# Altium footprint library myLibraryAltium.PcbLib: 215 footprints (part 8 of 14)
Each footprint in its own frame and in the unit in brackets; x right, y up, seen from the top. Pads: shape width x height; smd on the part's side, far side on the other; paste and mask are expansions set on the pad; w line width, h text height; cw(c..) or ccw(c..) is an arc to the next point about the centre after c.
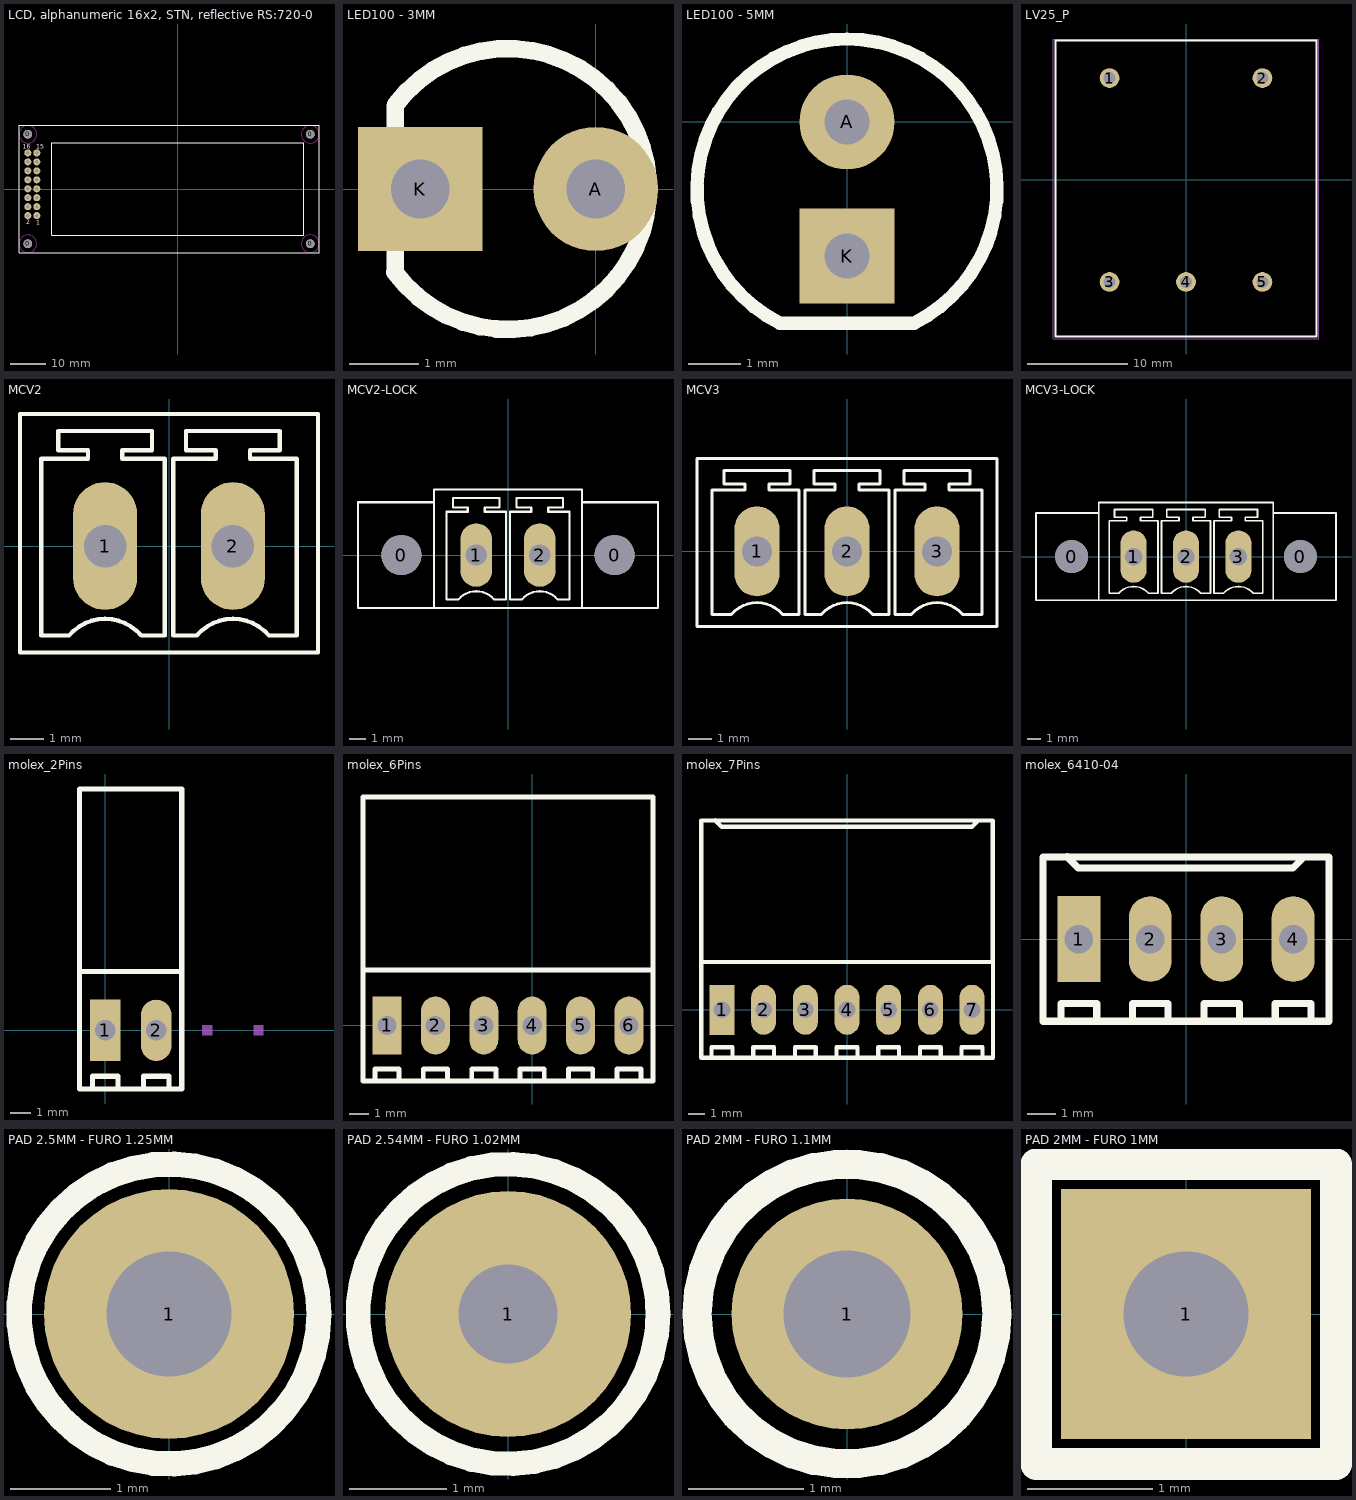
[diagram p7: the footprints below, top view; thin cyan lines are the x and y axes]

## LCD, alphanumeric 16x2, STN, reflective RS:720-0197 [mm]
pads (20):
  round 2.5 hole 2.5: 0(-42.5,-15.5) 0(-42.5,15.5) 0(37.5,-15.5) 0(37.5,15.5)
  round 2 hole 1: 1(-39.96,-7.55) 2(-42.5,-7.55) 3(-39.96,-5.01) 4(-42.5,-5.01) 5(-39.96,-2.47) 6(-42.5,-2.47) 7(-39.96,0.07) 8(-42.5,0.07) 9(-39.96,2.61) 10(-42.5,2.61) 11(-39.96,5.15) 12(-42.5,5.15) 13(-39.96,7.69) 14(-42.5,7.69) 15(-39.96,10.23) 16(-42.5,10.23)
Top Overlay:
  lines w0.254: -35.65,-13.15 35.65,-13.15 ; -35.65,-13.113 -35.65,13.15 35.65,13.15 35.65,-13.113 ; -45,-18 40,-18 40,18 -45,18 -45,-18
  text "1" at -40.174,-10.126 h1.25
  text "2" at -42.968,-9.999 h1.25
  text "15" at -40.174,11.464 h1.25
  text "16" at -43.984,11.464 h1.25
Bottom Overlay:
  lines w0.254: -31.5,-8.2 31.5,-8.2 31.5,8.2 -31.5,8.2 -31.5,-8.2 ; -27.86,-5.49 -24.86,-5.49 -24.86,-0.26 -27.86,-0.26 -27.86,-5.49 ; -27.86,0.26 -27.86,5.49 -24.86,5.49 -24.86,0.26 -27.86,0.26 ; -24.345,-5.49 -21.345,-5.49 -21.345,-0.26 -24.345,-0.26 -24.345,-5.49 ; -24.345,0.26 -24.345,5.49 -21.345,5.49 -21.345,0.26 -24.345,0.26 ; -20.83,-5.49 -17.83,-5.49 -17.83,-0.26 -20.83,-0.26 -20.83,-5.49 ; -20.83,0.26 -20.83,5.49 -17.83,5.49 -17.83,0.26 -20.83,0.26 ; -17.315,-5.49 -14.315,-5.49 -14.315,-0.26 -17.315,-0.26 -17.315,-5.49 ; -17.315,0.26 -17.315,5.49 -14.315,5.49 -14.315,0.26 -17.315,0.26 ; -13.8,-5.49 -10.8,-5.49 -10.8,-0.26 -13.8,-0.26 -13.8,-5.49 ; -13.8,0.26 -13.8,5.49 -10.8,5.49 -10.8,0.26 -13.8,0.26 ; -10.285,-5.49 -7.285,-5.49 -7.285,-0.26 -10.285,-0.26 -10.285,-5.49 ; -10.285,0.26 -10.285,5.49 -7.285,5.49 -7.285,0.26 -10.285,0.26 ; -6.77,-5.49 -3.77,-5.49 -3.77,-0.26 -6.77,-0.26 -6.77,-5.49 ; -6.77,0.26 -6.77,5.49 -3.77,5.49 -3.77,0.26 -6.77,0.26 ; -3.255,-5.49 -3.255,-0.26 -0.255,-0.26 -0.255,-5.49 -3.255,-5.49 ; -3.255,0.26 -0.255,0.26 -0.255,5.49 -3.255,5.49 -3.255,0.26 ; 0.255,-5.49 3.255,-5.49 3.255,-0.26 0.255,-0.26 0.255,-5.49 ; 0.255,0.26 0.255,5.49 3.255,5.49 3.255,0.26 0.255,0.26 ; 3.77,-5.49 3.77,-0.26 6.77,-0.26 6.77,-5.49 3.77,-5.49 ; 3.77,0.26 6.77,0.26 6.77,5.49 3.77,5.49 3.77,0.26 ; 7.285,-5.49 7.285,-0.26 10.285,-0.26 10.285,-5.49 7.285,-5.49 ; 7.285,0.26 10.285,0.26 10.285,5.49 7.285,5.49 7.285,0.26 ; 10.8,-5.49 10.8,-0.26 13.8,-0.26 13.8,-5.49 10.8,-5.49 ; 10.8,0.26 13.8,0.26 13.8,5.49 10.8,5.49 10.8,0.26 ; 14.315,-5.49 14.315,-0.26 17.315,-0.26 17.315,-5.49 14.315,-5.49 ; 14.315,0.26 17.315,0.26 17.315,5.49 14.315,5.49 14.315,0.26 ; 17.83,-5.49 17.83,-0.26 20.83,-0.26 20.83,-5.49 17.83,-5.49 ; 17.83,0.26 20.83,0.26 20.83,5.49 17.83,5.49 17.83,0.26 ; 21.345,-5.49 21.345,-0.26 24.345,-0.26 24.345,-5.49 21.345,-5.49 ; 21.345,0.26 24.345,0.26 24.345,5.49 21.345,5.49 21.345,0.26 ; 24.86,-5.49 24.86,-0.26 27.86,-0.26 27.86,-5.49 24.86,-5.49 ; 24.86,0.26 27.86,0.26 27.86,5.49 24.86,5.49 24.86,0.26
Keep-Out Layer:
  circle w0.254: c-42.5,-15.5 r2.5
  circle w0.254: c37.5,-15.5 r2.5
  circle w0.254: c37.5,15.5 r2.5
  circle w0.254: c-42.5,15.5 r2.5

## LED100 - 3MM [mm]
pads (2):
  round 1.8 hole 0.85: A(0,0)
  rect 1.8x1.8 hole 0.85: K(-2.54,0)
Top Overlay:
  lines w0.254: -2.906,-1.205 ccw(c-1.27,0) -2.893,1.223 ; -2.9,-1.2 -2.9,1.2

## LED100 - 5MM [mm]
pads (2):
  round 1.8 hole 0.85: A(0,0)
  rect 1.8x1.8 hole 0.85: K(0,-2.54)
Top Overlay:
  lines w0.254: -1.27,-3.81 cw(c0,-1.27) 1.27,-3.81 -1.27,-3.81

## LV25_P [mm] "LEM Voltage Transducer"
pads (5):
  round 1.962 hole 1.2: 1(-7.62,10.16) 2(7.62,10.16) 3(-7.62,-10.16) 4(0,-10.16) 5(7.62,-10.16)
Top Overlay:
  lines w0.2: -13,13.85 -13,-15.6 13,-15.6 13,13.85 ; -13,13.9 13,13.9
Mechanical 1:
  lines w0.05: -13.25,-15.85 13.25,-15.85 13.25,14.05 -13.25,14.05 -13.25,-15.85
3D body "User Library-LV25-P_LEM.STEP": height 17.2, standoff -2.55, extent -13,-15.45 13,13.75

## MCV2 [mm]
pads (2):
  oval 1.905x3.81 hole 1.27: 1(-1.905,0) 2(1.905,0)
Top Overlay:
  lines w0.127: -4.445,-3.175 4.445,-3.175 4.445,3.937 -4.445,3.937 -4.445,-3.175 ; -3.81,-2.667 -3.81,2.603 -2.413,2.603 -2.413,2.857 -3.302,2.857 -3.302,3.429 -0.508,3.429 -0.508,2.857 -1.397,2.857 -1.397,2.603 -0.127,2.603 -0.127,-2.667 -0.826,-2.667 ccw(c-1.905,-3.588) -2.984,-2.667 -3.81,-2.667 ; 0.127,-2.667 0.127,2.603 1.397,2.603 1.397,2.857 0.508,2.857 0.508,3.429 3.302,3.429 3.302,2.857 2.413,2.857 2.413,2.603 3.81,2.603 3.81,-2.667 2.984,-2.667 ccw(c1.905,-3.588) 0.826,-2.667 0.127,-2.667

## MCV2-LOCK [mm]
pads (4):
  round 2.4 hole 2.4: 0(-6.405,0) 0(6.405,0)
  oval 1.905x3.81 hole 1.27: 1(-1.905,0) 2(1.905,0)
Top Overlay:
  lines w0.127: -4.445,-3.175 -4.445,3.175 ; -4.445,-3.175 4.445,-3.175 ; -4.445,-3.175 -9.005,-3.175 -9.005,3.175 -4.445,3.175 ; -4.445,3.175 -4.445,3.937 4.445,3.937 4.445,3.175 ; 4.445,-3.175 4.445,3.175 ; 4.445,-3.175 9.005,-3.175 9.005,3.175 4.445,3.175 ; -3.683,-2.667 -3.683,2.603 -2.413,2.603 -2.413,2.857 -3.302,2.857 -3.302,3.429 -0.508,3.429 -0.508,2.857 -1.397,2.857 -1.397,2.603 -0.127,2.603 -0.127,-2.667 -0.826,-2.667 ccw(c-1.905,-3.588) -2.984,-2.667 -3.683,-2.667 ; 0.127,-2.667 0.127,2.603 1.397,2.603 1.397,2.857 0.508,2.857 0.508,3.429 3.302,3.429 3.302,2.857 2.413,2.857 2.413,2.603 3.683,2.603 3.683,-2.667 2.984,-2.667 ccw(c1.905,-3.588) 0.826,-2.667 0.127,-2.667
3D body "MCV_2_L.stp": height 9.3, standoff -3.3, extent -8.968,-3.219 9.042,4.031

## MCV3 [mm]
pads (3):
  oval 1.905x3.81 hole 1.27: 1(-3.81,0) 2(0,0) 3(3.81,0)
Top Overlay:
  lines w0.127: -6.35,-3.175 6.35,-3.175 6.35,3.937 -6.35,3.937 -6.35,-3.175 ; -5.715,-2.667 -5.715,2.603 -4.318,2.603 -4.318,2.857 -5.207,2.857 -5.207,3.429 -2.413,3.429 -2.413,2.857 -3.302,2.857 -3.302,2.603 -2.032,2.603 -2.032,-2.667 -2.73,-2.667 ccw(c-3.81,-3.588) -4.89,-2.667 -5.715,-2.667 ; -1.778,-2.667 -1.778,2.603 -0.508,2.603 -0.508,2.857 -1.397,2.857 -1.397,3.429 1.397,3.429 1.397,2.857 0.508,2.857 0.508,2.603 1.778,2.603 1.778,-2.667 1.079,-2.667 ccw(c0,-3.588) -1.08,-2.667 -1.778,-2.667 ; 2.032,-2.667 2.032,2.603 3.302,2.603 3.302,2.857 2.413,2.857 2.413,3.429 5.207,3.429 5.207,2.857 4.318,2.857 4.318,2.603 5.715,2.603 5.715,-2.667 4.889,-2.667 ccw(c3.81,-3.588) 2.73,-2.667 2.032,-2.667

## MCV3-LOCK [mm]
pads (5):
  round 2.4 hole 2.4: 0(-8.31,0) 0(8.31,0)
  oval 1.905x3.81 hole 1.27: 1(-3.81,0) 2(0,0) 3(3.81,0)
Top Overlay:
  lines w0.127: -6.35,-3.175 -6.35,3.175 ; -6.35,-3.175 6.35,-3.175 ; -6.35,-3.175 -10.91,-3.175 -10.91,3.175 -6.35,3.175 ; -6.35,3.175 -6.35,3.937 6.35,3.937 6.35,3.175 ; 6.35,-3.175 6.35,3.175 ; 6.35,-3.175 10.91,-3.175 10.91,3.175 6.35,3.175 ; -5.588,-2.667 -5.588,2.603 -4.318,2.603 -4.318,2.857 -5.207,2.857 -5.207,3.429 -2.413,3.429 -2.413,2.857 -3.302,2.857 -3.302,2.603 -2.032,2.603 -2.032,-2.667 -2.73,-2.667 ccw(c-3.81,-3.588) -4.89,-2.667 -5.588,-2.667 ; -1.778,-2.667 -1.778,2.603 -0.508,2.603 -0.508,2.857 -1.397,2.857 -1.397,3.429 1.397,3.429 1.397,2.857 0.508,2.857 0.508,2.603 1.778,2.603 1.778,-2.667 1.079,-2.667 ccw(c0,-3.588) -1.08,-2.667 -1.778,-2.667 ; 2.032,-2.667 2.032,2.603 3.302,2.603 3.302,2.857 2.413,2.857 2.413,3.429 5.207,3.429 5.207,2.857 4.318,2.857 4.318,2.603 5.588,2.603 5.588,-2.667 4.889,-2.667 ccw(c3.81,-3.588) 2.73,-2.667 2.032,-2.667
3D body "MCV_3_L.stp": height 9.2, standoff -3.4, extent -10.91,-3.175 10.91,4.075

## molex_2Pins [mil]
pads (2):
  rect 60x120 hole 40: 1(0,0)
  oval 60x120 hole 40: 2(100,0)
Top Overlay:
  lines w10: -50,115.16 -50,472.44 150.59,472.44 ; -25,-115 -25,-90 25,-90 25,-115 ; 75,-115 75,-90 125,-90 125,-115 ; 149.61,-115 -50,-115 -50,0 -50,115 149.45,115 150,115.55 150,472.44 ; 150,-115 150,0 150,115
Mechanical 18:
  rectangle: 290,-10 310,10
  rectangle: 190,-10 210,10
  rectangle: 90,-10 110,10
  rectangle: -10,-10 10,10
3D body "022053021.stp": height 203.74, standoff -187.26, extent -45.81,-10.25 148.19,498.75

## molex_6Pins [mil]
pads (6):
  rect 60x120 hole 40: 1(-300,0)
  oval 60x120 hole 40: 2(-200,0) 3(-100,0) 4(0,0) 5(100,0) 6(200,0)
Top Overlay:
  lines w10: -350,115.16 -350,472.44 250,472.44 250,115 ; -325,-115 -325,-90 -275,-90 -275,-115 ; -225,-115 -225,-90 -175,-90 -175,-115 ; -125,-115 -125,-90 -75,-90 -75,-115 ; -25,-115 -25,-90 25,-90 25,-115 ; 75,-115 75,-90 125,-90 125,-115 ; 175,-115 175,-90 225,-90 225,-115 ; 250,115 -350,115 -350,0 -350,-115 250,-115 250,0 250,115
Mechanical 18:
  rectangle: -10,-10 10,10
  rectangle: -110,-10 -90,10
  rectangle: -210,-10 -190,10
  rectangle: -310,-10 -290,10
3D body "22-23-2061.stp": height 436.24, standoff -123.76, extent -353.15,-125.98 246.85,124.02

## molex_7Pins [mil]
pads (7):
  rect 60x120 hole 40: 1(-300,0)
  oval 60x120 hole 40: 2(-200,0) 3(-100,0) 4(0,0) 5(100,0) 6(200,0) 7(300,0)
Top Overlay:
  lines w10: -350,115.16 -350,454.57 348.58,454.57 349.61,453.54 349.61,116.14 ; -325,-115 -325,-90 -275,-90 -275,-115 ; -316.34,454.72 -300.79,439.17 -300,439.17 -290,439.17 297.83,439.17 ; -225,-115 -225,-90 -175,-90 -175,-115 ; -125,-115 -125,-90 -75,-90 -75,-115 ; -25,-115 -25,-90 25,-90 25,-115 ; 15.39,454.57 18.31,454.57 ; 75,-115 75,-90 125,-90 125,-115 ; 175,-115 175,-90 225,-90 225,-115 ; 275,-115 275,-90 325,-90 325,-115 ; 300,439.17 315.39,454.57 ; -350,-115 -350,0 -350,115 350,115 350,0 350,-115 -350,-115
Mechanical 18:
  rectangle: -310,-10 -290,10
  rectangle: -210,-10 -190,10
  rectangle: -110,-10 -90,10
  rectangle: -10,-10 10,10
3D body "User Library-Header Rt Angle Lock Molex 7478.step": height 275.59, standoff -115.41, extent -348.43,-17.61 351.57,499.89

## molex_6410-04 [mil]
pads (4):
  rect 60x120 hole 40: 1(-150,0)
  oval 60x120 hole 40: 2(-50,0) 3(50,0) 4(150,0)
Top Overlay:
  lines w10: -175,-115 -175,-90 -125,-90 -125,-115 ; -166.34,115.16 -150.79,99.61 -150,99.61 -140,99.61 140,99.61 150,99.61 165.39,115 168.31,115 ; -75,-115 -75,-90 -25,-90 -25,-115 ; 25,-115 25,-90 75,-90 75,-115 ; 125,-115 125,-90 175,-90 175,-115 ; -200,-115 200,-115 200,0 200,115 -200,115 -200,0 -200,-115
Mechanical 18:
  rectangle: 140,-10 160,10
  rectangle: 40,-10 60,10
  rectangle: -60,-10 -40,10
  rectangle: -160,-10 -140,10
3D body "User Library-Molex 4 pines.STEP": height 464.54, standoff -137.77, extent -198.82,-117.13 200.79,119.09

## PAD 2.5MM - FURO 1.25MM [mm]
pads (1):
  round 2.5 hole 1.25: 1(0,0)
Top Overlay:
  circle w0.254: c0,0 r1.5
3D body "User Library-Test Point Keystone - 5004 YELLOW.STEP": height 4.57, standoff -3.05, extent -1.27,-1.27 1.27,1.27

## PAD 2.54MM - FURO 1.02MM [mm]
pads (1):
  round 2.54 hole 1.02: 1(0,0)
Top Overlay:
  circle w0.254: c0,0 r1.55
3D body "User Library-Test Point Keystone - 5004 YELLOW.STEP": height 4.57, standoff -3.05, extent -1.27,-1.27 1.27,1.27

## PAD 2MM - FURO 1.1MM [mm]
pads (1):
  round 2 hole 1.1: 1(0,0)
Top Overlay:
  circle w0.254: c0,0 r1.3

## PAD 2MM - FURO 1MM [mm]
pads (1):
  rect 2x2 hole 1: 1(0,0)
Top Overlay:
  lines w0.254: -1.2,-1.2 -1.2,1.2 1.2,1.2 1.2,-1.2 -1.2,-1.2
3D body "User Library-Test Point Keystone - 5004 YELLOW.STEP": height 4.57, standoff -3.05, extent -1.27,-1.27 1.27,1.27